# Altium footprint library MH_DA_THU_VIEN_16122016.PcbLib: 531 footprints (part 29 of 34)
Each footprint in its own frame and in the unit in brackets; x right, y up, seen from the top. Pads: shape width x height; smd on the part's side, far side on the other; paste and mask are expansions set on the pad; w line width, h text height; cw(c..) or ccw(c..) is an arc to the next point about the centre after c.
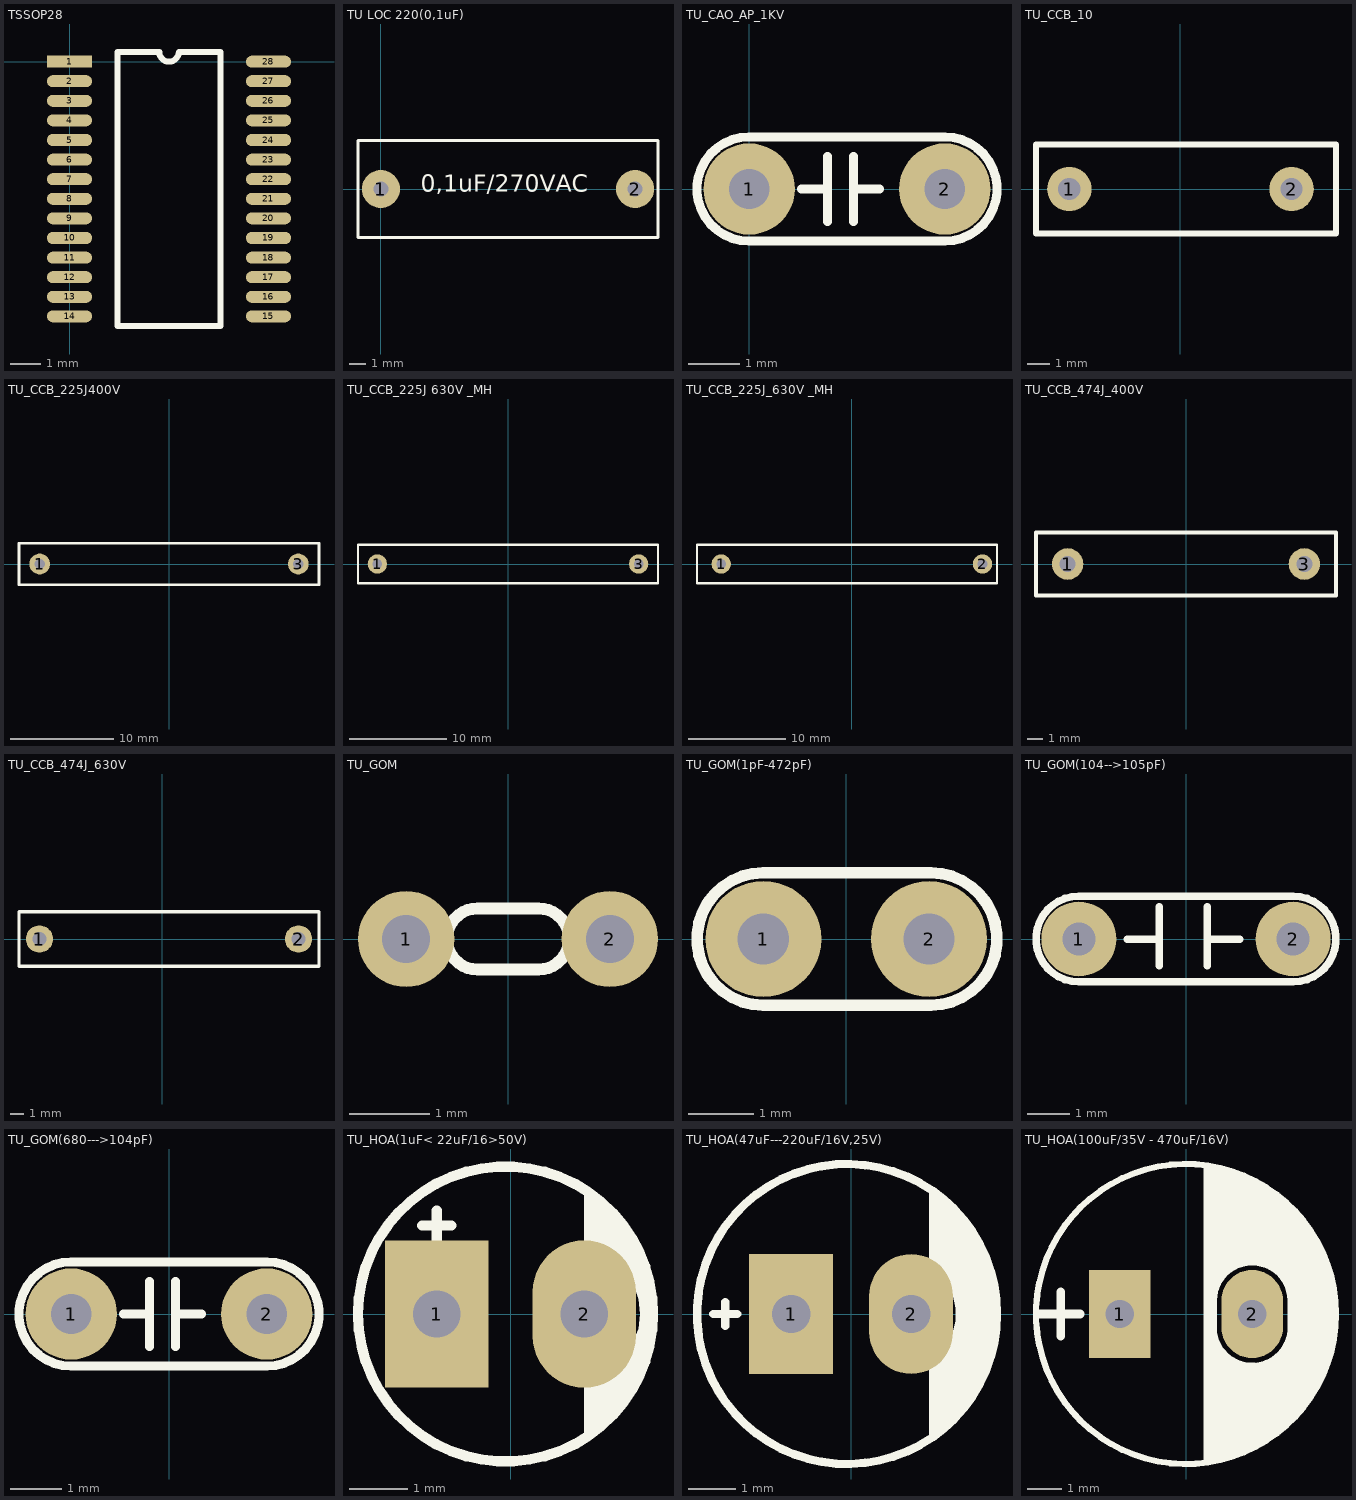
[diagram p28: the footprints below, top view; thin cyan lines are the x and y axes]

## TSSOP28 [mm]
pads (28):
  rect 1.5x0.4 smd: 1(0,0)
  oval 1.5x0.4 smd: 2(0,-0.65) 3(0,-1.3) 4(0,-1.95) 5(0,-2.6) 6(0,-3.25) 7(0,-3.9) 8(0,-4.55) 9(0,-5.2) 10(0,-5.85) 11(0,-6.5) 12(0,-7.15) 13(0,-7.8) 14(0,-8.45) 15(6.6,-8.45) 16(6.6,-7.8) 17(6.6,-7.15) 18(6.6,-6.5) 19(6.6,-5.85) 20(6.6,-5.2) 21(6.6,-4.55) 22(6.6,-3.9) 23(6.6,-3.25) 24(6.6,-2.6) 25(6.6,-1.95) 26(6.6,-1.3) 27(6.6,-0.65) 28(6.6,0)
Top Overlay:
  lines w0.2: 1.585,0.325 1.585,-8.775 5.015,-8.775 5.015,0.325 3.625,0.325 cw(c3.3,0.325) 2.975,0.325 ; 1.593,0.325 2.983,0.325
3D body: height 0.95, standoff -0.03, extent 0.102,-9.065 6.502,0.635

## TU LOC 220(0,1uF) [mil] "Tu loc 220"
height 100
pads (2):
  round 90 hole 35: 1(0,0) 2(600,0)
Top Overlay:
  lines w7: -54,-115 654,-115 654,115 -54,115 -54,-115
  text "0,1uF/270VAC" at 94,-21 h70

## TU_CAO_AP_1KV [mil]
height 200
pads (2):
  round 70 hole 31: 1(0,0) 2(150,0)
Top Overlay:
  lines w7: 40,0 60,0 ; 60,-25 60,25 ; 80,-25 80,25 ; 80,0 100,0 ; 0,-40 cw(c0,0) 0,40 150,40 cw(c150,0) 150,-40 0,-40
3D body: height 235, standoff -76.85, extent -39.86,-33.39 190,33.4

## TU_CCB_10 [mm]
pads (2):
  round 2 hole 1: 1(-5,0) 2(5,0)
Top Overlay:
  lines w0.254: -6.5,-2 -6.5,2 7,2 7,-2 -6.5,-2

## TU_CCB_225J400V [mm]
pads (2):
  round 2 hole 1: 1(-12.5,0) 3(12.5,0)
Top Overlay:
  lines w0.254: -14.5,-2 -14.5,2 14.5,2 14.5,-2 -14.5,-2
3D body: height 18.5, standoff -10, extent -14.489,-4.489 14.489,4.489

## TU_CCB_225J 630V _MH [mm]
pads (2):
  round 2 hole 1: 1(-13.5,0) 3(13.5,0)
Top Overlay:
  lines w0.254: -15.5,-2 -15.5,2 15.5,2 15.5,-2 -15.5,-2
3D body: height 23.5, standoff -10, extent -15.492,-5.995 15.493,5.995

## TU_CCB_225J_630V _MH [mm]
pads (2):
  round 2 hole 1: 1(-13.5,0) 2(13.5,0)
Top Overlay:
  lines w0.254: -16,-2 -16,2 15,2 15,-2 -16,-2

## TU_CCB_474J_400V [mm]
pads (2):
  round 2 hole 1: 1(-7.5,0) 3(7.5,0)
Top Overlay:
  lines w0.254: -9.5,-2 -9.5,2 9.5,2 9.5,-2 -9.5,-2
3D body: height 16, standoff -10, extent -9.249,-3.75 9.25,3.75

## TU_CCB_474J_630V [mm]
pads (2):
  round 2 hole 1: 1(-9,0) 2(10,0)
Top Overlay:
  lines w0.254: -10.5,-2 11.5,-2 11.5,2 -10.5,2 -10.5,-2
3D body: height 17.5, standoff -10, extent -10.997,-3.499 11.997,4

## TU_GOM [mm] "Tu gom mini"
pads (2):
  round 1.2 hole 0.6: 1(-1.27,0) 2(1.27,0)
Top Overlay:
  lines w0.15: -0.381,-0.381 cw(c-0.381,0) -0.381,0.381 0.381,0.381 cw(c0.381,0) 0.381,-0.381 -0.381,-0.381
3D body: height 6.12, standoff -1.8, extent -2.917,-0.848 2.921,0.848

## TU_GOM(1pF-472pF) [mil]
height 200
pads (2):
  round 70 hole 31: 1(-50,0) 2(50,0)
Top Overlay:
  lines w7: 50,-40 -50,-40 cw(c-50,0) -50,40 50,40 ; 51,-40 ccw(c51,0) 51,40
3D body: height 265, standoff -46.85, extent -109.93,-30 119.93,36.79

## TU_GOM(104-->105pF) [mil]
height 200
pads (2):
  round 70 hole 31: 1(-100,0) 2(100,0)
Top Overlay:
  lines w7: -55,0 -25,0 ; -25,-25 -25,30 ; 20,-25 20,30 ; 20,0 50,0 ; -100,-40 cw(c-100,0) -100,40 100,40 cw(c100,0) 100,-40 -100,-40
3D body: height 407.48, standoff -87.28, extent -154.48,-44.22 160.48,54.6

## TU_GOM(680--->104pF) [mil]
height 200
pads (2):
  round 70 hole 31: 1(-75,0) 2(75,0)
Top Overlay:
  lines w7: -35,0 -15,0 ; -15,-25 -15,25 ; 5,-25 5,25 ; 5,0 25,0 ; -75,-40 cw(c-75,0) -75,40 75,40 cw(c75,0) 75,-40 -75,-40
3D body: height 235, standoff -76.85, extent -114.86,-33.39 115,33.4

## TU_HOA(1uF< 22uF/16>50V) [mil] "Tu hoa < 22uF/16>50V"
height 300
pads (2):
  rect 70x100 hole 32: 1(-50,0)
  oval 70x100 hole 32: 2(50,0)
Top Overlay:
  circle w7: c-3.42,0 r100
  region: 50,84 50,38 62,36 72,32 79,27 84,19 87,10 88,0 87,-10 84,-17 79,-24 73,-31 67,-35 57,-38 50,-38 50,-85 58,-78 70,-69 78,-59 87,-44 94,-19 96,9 89,40 77,60 60,79
  lines w7: -60,60 -40,60 ; -50,50 -50,70
3D body: height 287.03, standoff -138.05, extent -99.42,-99.42 99.42,99.42

## TU_HOA(47uF---220uF/16V,25V) [mil]
height 300
pads (2):
  rect 70x100 hole 32: 1(-50,0)
  oval 70x100 hole 32: 2(50,0)
Top Overlay:
  circle w7: c-3.42,0 r125
  region: 65,105 65,36 72,31 79,25 83,20 85,15 87,5 87,-6 85,-14 82,-19 78,-24 74,-28 70,-31 65,-34 65,-107 74,-99 89,-86 102,-69 117,-36 121,-15 121.58,0 117,30 103,67 81,93
  lines w7: -115,0 -95,0 ; -105,-10 -105,-5 -105,5 -105,10
3D body: height 421.54, standoff -759.57, extent -126,-124.03 122.03,124

## TU_HOA(100uF/35V - 470uF/16V) [mil]
pads (2):
  rect 70x100 hole 32: 1(-75,0)
  oval 70x100 hole 32: 2(75,0)
Top Overlay:
  circle w7: c0,0 r170
  region: 25,25 60,60 87.93,60.33 94.59,59.01 100.24,55.24 100,55 106.63,48.7 109.3,44.71 110.24,40 110,40 115.24,35.24 119.01,29.59 120.33,22.93 120,22.93 120.33,-27.93 119.01,-34.59 115.24,-40.24 115,-40 103.7,-51.63 99.71,-54.3 95,-55.24 95.24,-55.24 89.59,-59.01 82.93,-60.33 82.93,-60 69.14,-60.29 60.23,-59.12 51.92,-55.68 44.79,-50.21 45,-50 33.37,-38.7 30.7,-34.71 29.76,-30 30,-30 25,-30 25,-170 80,-150 120,-120 150,-80 170,-20 170,20 155,70 125,115 90,145 45,165 25,170
  lines w10: -165,0 -120,0 ; -142,-25 -142,25 ; 25,-165 25,165 ; 25,25 30,25 ; 30,-20 30,30 ; 30,-10 ccw(c75,-15) 70,-60 ccw(c75,-15) 120,-20 120,15 ccw(c75,15) 75,60 ccw(c75,15) 30,15
3D body: height 445.89, standoff -754.41, extent -159.96,-157.48 155,157.48